# Altium schematic symbol library LATTICEPLDS_Library.SchLib: 291 symbols (part 29 of 32)
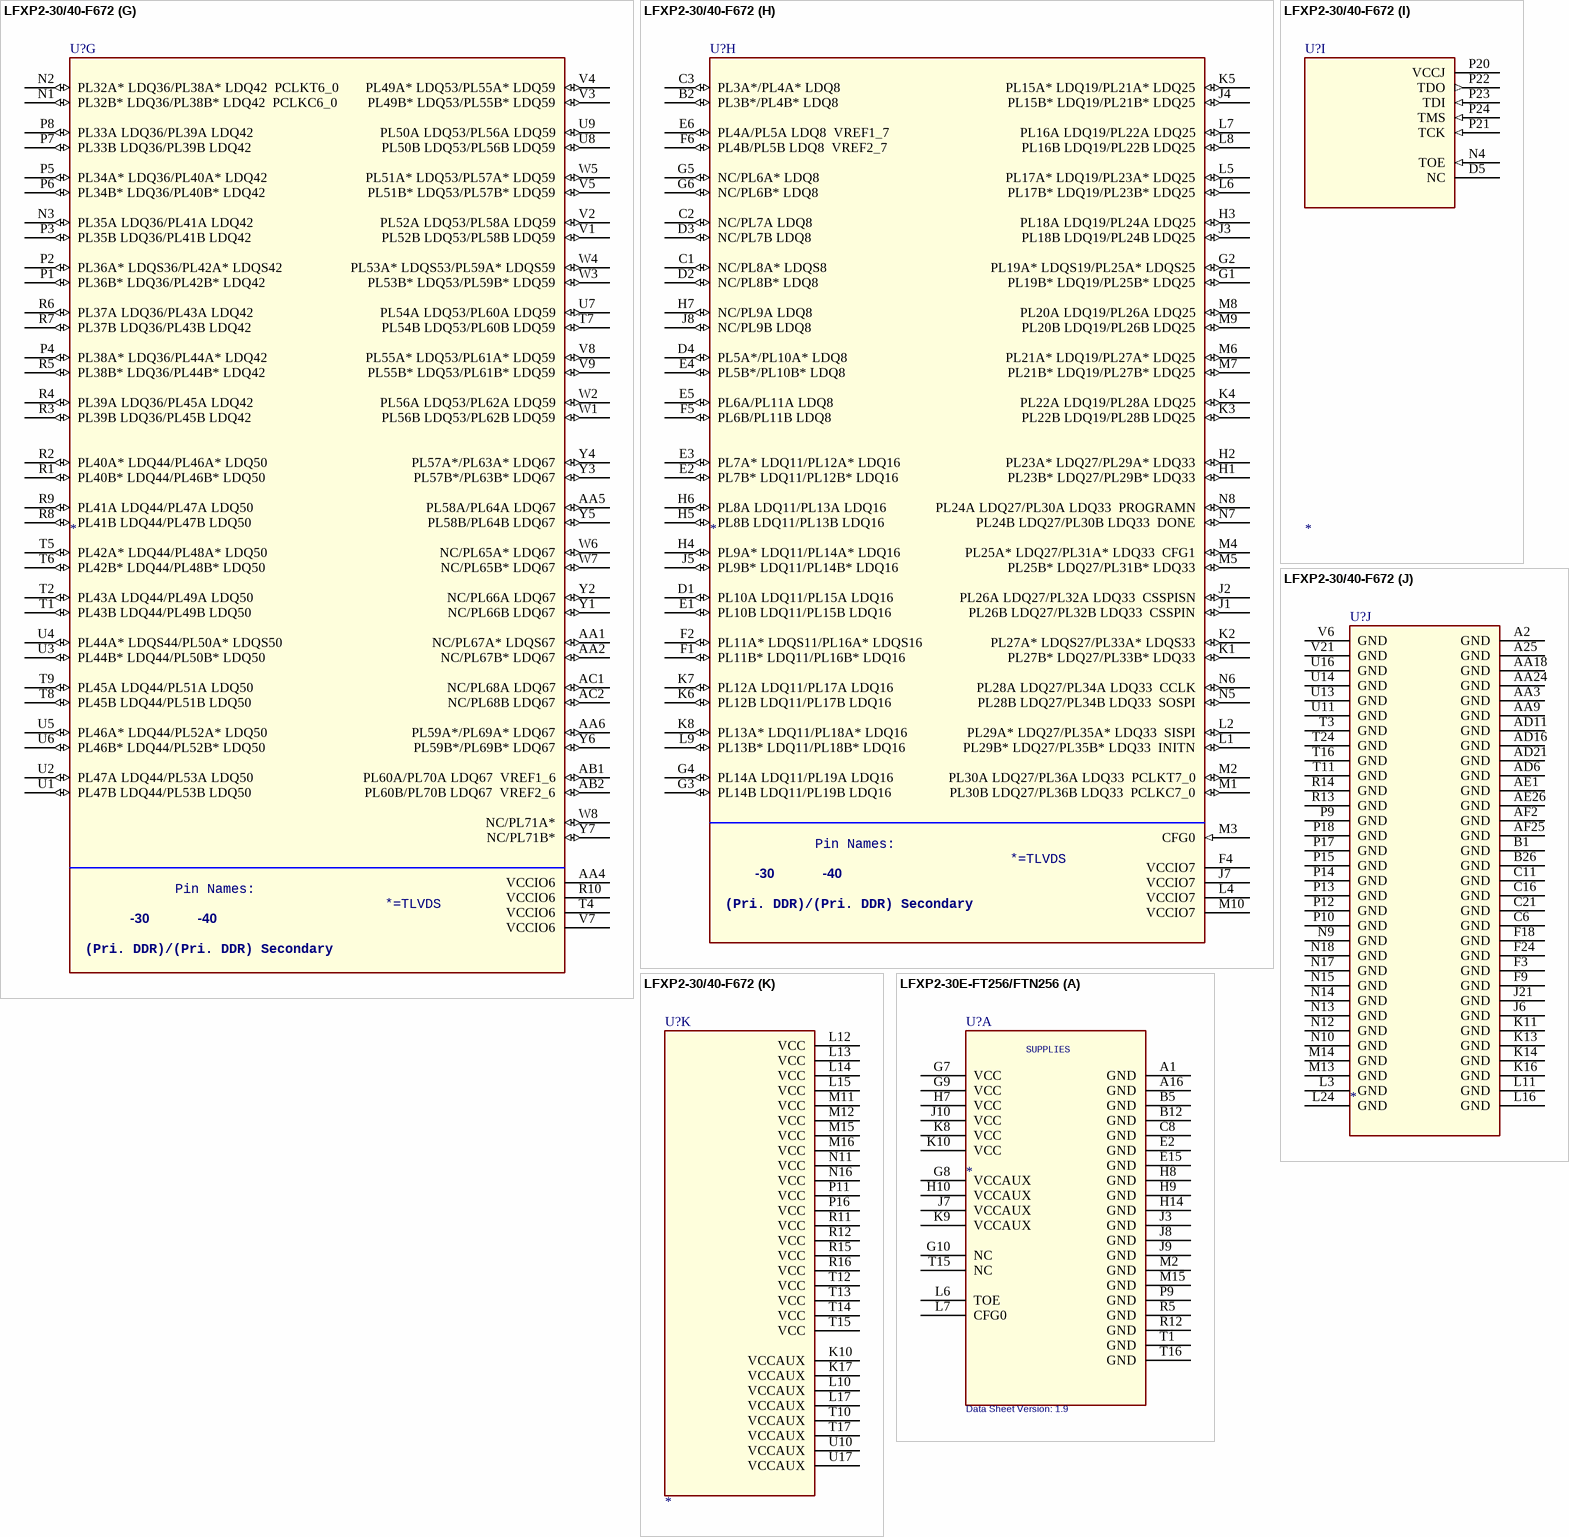
[diagram p331: symbols LFXP2-30/40-F672 to LFXP2-30E-FT256/FTN256]

## LFXP2-30/40-F672
designator U?
SWAP_INFO: (S1+S2+S3+S4+S5+S6+S7+S8+S9+S10+S11); SPLIT_INST: TRUE
part A pins: A3 PT4B TDQ6/PT4B TDQ6  ULC_GPLLC_IN_A (io), A4 PT9A TDQ6/PT9A TDQ6 (io), A5 PT9B TDQ6/PT9B TDQ6 (io), A6 PT10B TDQ6/PT10B TDQ6 (io), A7 PT14A TDQ15/PT14A TDQ15 (io), A8 PT17A TDQ15/PT17A TDQ15 (io), A9 PT18A TDQ15/PT18A TDQ15 (io), A10 PT22A TDQ24/PT22A TDQ24 (io), A11 PT25A TDQ24/PT25A TDQ24 (io), A12 PT26A TDQ24/PT26A TDQ24 (io), A13 PT29A TDQ33/PT29A TDQ33 (io), A14 PT33A TDQS33/PT33A TDQS33 (io), B3 PT4A TDQ6/PT4A TDQ6  ULC_GPLLT_IN_A (io), B4 PT6A TDQS6/PT6A TDQS6 (io), B5 PT6B TDQ6/PT6B TDQ6 (io), B6 PT10A TDQ6/PT10A TDQ6 (io), B7 PT14B TDQ15/PT14B TDQ15 (io), B8 PT17B TDQ15/PT17B TDQ15 (io), B9 PT18B TDQ15/PT18B TDQ15 (io), B10 PT22B TDQ24/PT22B TDQ24 (io), B11 PT25B TDQ24/PT25B TDQ24 (io), B12 PT26B TDQ24/PT26B TDQ24 (io), B13 PT29B TDQ33/PT29B TDQ33 (io), B14 PT33B TDQ33/PT33B TDQ33 (io), C4 PT5A TDQ6/PT5A TDQ6  ULC_GPLLT_FB_A (io), C5 PT5B TDQ6/PT5B TDQ6  ULC_GPLLC_FB_A (io), C7 PT7B TDQ6/PT7B TDQ6 (io), C8 PT13A TDQ15/PT13A TDQ15 (io), C9 PT15B TDQ15/PT15B TDQ15 (io), C10 PT21A TDQ24/PT21A TDQ24 (io), C12 PT30A TDQ33/PT30A TDQ33 (io), C13 PT34A TDQ33/PT34A TDQ33 (io), C14 PT37A TDQ33/PT37A TDQ33  PCLKT0_0 (io), C15 PT37B TDQ33/PT37B TDQ33  PCLKC0_0 (io), D6 VCCIO0 (power), D7 PT7A TDQ6/PT7A TDQ6 (io), D8 PT13B TDQ15/PT13B TDQ15 (io), D9 PT15A TDQS15/PT15A TDQS15 (io), D10 PT21B TDQ24/PT21B TDQ24 (io), D11 VCCIO0 (power), D12 PT30B TDQ33/PT30B TDQ33 (io), D13 PT34B TDQ33/PT34B TDQ33 (io), E7 PT11A TDQ15/PT11A TDQ15 (io), E8 PT11B TDQ15/PT11B TDQ15 (io), E9 PT16A TDQ15/PT16A TDQ15 (io), E10 PT16B TDQ15/PT16B TDQ15 (io), E11 PT27B TDQ24/PT27B TDQ24 (io), E12 PT31B TDQ33/PT31B TDQ33 (io), E13 PT35B TDQ33/PT35B TDQ33 (io), F7 PT3A TDQ6/PT3A TDQ6  VREF1_0 (io), F8 PT8B TDQ6/PT8B TDQ6 (io), F10 PT23B TDQ24/PT23B TDQ24 (io), F11 PT27A TDQ24/PT27A TDQ24 (io), F12 PT31A TDQ33/PT31A TDQ33 (io), F13 PT35A TDQ33/PT35A TDQ33 (io), G7 PT3B TDQ6/PT3B TDQ6  VREF2_0 (io), G8 PT8A TDQ6/PT8A TDQ6 (io), G9 VCCIO0 (power), G10 PT19B TDQ15/PT19B TDQ15 (io), G11 PT23A TDQ24/PT23A TDQ24 (io), G12 PT32A TDQ33/PT32A TDQ33 (io), G13 PT32B TDQ33/PT32B TDQ33 (io), H8 PT12B TDQ15/PT12B TDQ15 (io), H9 PT12A TDQ15/PT12A TDQ15 (io), H10 PT19A TDQ15/PT19A TDQ15 (io), H11 PT24A TDQS24/PT24A TDQS24 (io), H12 PT28A TDQ24/PT28A TDQ24 (io), H13 PT36B TDQ33/PT36B TDQ33 (io), J9 PT20A TDQ24/PT20A TDQ24 (io), J10 PT24B TDQ24/PT24B TDQ24 (io), J11 PT28B TDQ24/PT28B TDQ24 (io), J12 PT36A TDQ33/PT36A TDQ33 (io), K9 PT20B TDQ24/PT20B TDQ24 (io), K12 VCCIO0 (power)
part B pins: A15 PT38A TDQ42/PT38A TDQ42  PCLKT1_0 (io), A16 PT41A TDQ42/PT41A TDQ42 (io), A17 PT42A TDQS42/PT42A TDQS42 (io), A18 PT45A TDQ42/PT45A TDQ42 (io), A19 PT46A TDQ42/PT46A TDQ42 (io), A20 PT53A TDQ51/PT53A TDQ51 (io), A21 PT58A TDQ60/PT58A TDQ60 (io), A22 PT61A TDQ60/PT61A TDQ60 (io), A23 PT61B TDQ60/PT61B TDQ60 (io), A24 NC/PT62B TDQ60 (io), B15 PT38B TDQ42/PT38B TDQ42  PCLKC1_0 (io), B16 PT41B TDQ42/PT41B TDQ42 (io), B17 PT42B TDQ42/PT42B TDQ42 (io), B18 PT45B TDQ42/PT45B TDQ42 (io), B19 PT46B TDQ42/PT46B TDQ42 (io), B20 PT53B TDQ51/PT53B TDQ51 (io), B21 PT58B TDQ60/PT58B TDQ60 (io), B22 NC/PT63A TDQ60 (io), B23 NC/PT62A TDQ60 (io), B24 NC/PT65B TDQ69 (io), B25 NC/PT66B TDQ69 (io), C17 PT47B TDQ51/PT47B TDQ51 (io), C18 PT49A TDQ51/PT49A TDQ51 (io), C19 PT50A TDQ51/PT50A TDQ51 (io), C20 PT54A TDQ51/PT54A TDQ51 (io), C22 NC/PT63B TDQ60 (io), C23 NC/PT65A TDQ69 (io), C24 NC/PT66A TDQ69 (io), C25 PT63A TDQ60/PT71A TDQ69  URC_GPLLT_FB_A (io), C26 PT63B TDQ60/PT71B TDQ69  URC_GPLLC_FB_A (io), D14 PT39B TDQ42/PT39B TDQ42 (io), D15 PT43B TDQ42/PT43B TDQ42 (io), D16 VCCIO1 (power), D17 PT47A TDQ51/PT47A TDQ51 (io), D18 PT49B TDQ51/PT49B TDQ51 (io), D19 PT50B TDQ51/PT50B TDQ51 (io), D20 PT54B TDQ51/PT54B TDQ51 (io), D21 VCCIO1 (power), D22 NC/PT67A TDQ69 (io), D23 NC/PT69A TDQS69 (io), E14 PT43A TDQ42/PT43A TDQ42 (io), E15 PT48A TDQ51/PT48A TDQ51 (io), E16 PT51B TDQ51/PT51B TDQ51 (io), E17 PT55B TDQ51/PT55B TDQ51 (io), E18 PT55A TDQ51/PT55A TDQ51 (io), E19 PT57A TDQ60/PT57A TDQ60 (io), E20 PT59B TDQ60/PT59B TDQ60 (io), E21 PT59A TDQ60/PT59A TDQ60 (io), E22 NC/PT67B TDQ69 (io), E23 NC/PT69B TDQ69 (io), F14 PT39A TDQ42/PT39A TDQ42 (io), F15 PT48B TDQ51/PT48B TDQ51 (io), F16 PT51A TDQS51/PT51A TDQS51 (io), F17 PT56B TDQ60/PT56B TDQ60 (io), F19 PT57B TDQ60/PT57B TDQ60 (io), F20 PT62A TDQ60/PT70A TDQ69  URC_GPLLT_IN_A (io), G14 PT44A TDQ42/PT44A TDQ42 (io), G15 PT44B TDQ42/PT44B TDQ42 (io), G16 PT56A TDQ60/PT56A TDQ60 (io), G17 NC/PT64A TDQ60 (io), G18 VCCIO1 (power), G19 PT62B TDQ60/PT70B TDQ69  URC_GPLLC_IN_A (io), G20 PT64B TDQ60/PT72B TDQ69  VREF2_1 (io), H14 PT40B TDQ42/PT40B TDQ42 (io), H15 PT52B TDQ51/PT52B TDQ51 (io), H16 NC/PT64B TDQ60 (io), H17 NC/PT68B TDQ69 (io), H18 NC/PT68A TDQ69 (io), H19 PT64A TDQ60/PT72A TDQ69  VREF1_1 (io), J13 PT40A TDQ42/PT40A TDQ42 (io), J14 PT52A TDQ51/PT52A TDQ51 (io), J15 PT60A TDQS60/PT60A TDQS60 (io), J16 PT60B TDQ60/PT60B TDQ60 (io), K15 VCCIO1 (power)
part C pins: D24 PR3A*/PR4A* RDQ8 (io), D25 PR6A/PR7A RDQ8 (io), D26 PR6B/PR7B RDQ8 (io), E24 PR3B*/PR4B* RDQ8 (io), E25 NC/PR8A* RDQS8 (io), E26 NC/PR8B* RDQ8 (io), F21 PR5B*/PR6B* RDQ8 (io), F22 PR4B/PR5B RDQ8  VREF2_2 (io), F23 VCCIO2 (power), F25 PR7A* RDQ11/PR12A* RDQ16 (io), F26 PR7B* RDQ11/PR12B* RDQ16 (io), G21 PR4A/PR5A RDQ8  VREF1_2 (io), G22 PR5A*/PR6A* RDQ8 (io), G23 NC/PR11B RDQ8 (io), G24 NC/PR11A RDQ8 (io), G25 PR10B RDQ11/PR15B RDQ16 (io), G26 PR10A RDQ11/PR15A RDQ16 (io), H20 NC/PR9A RDQ8 (io), H21 NC/PR9B RDQ8 (io), H22 PR8A RDQ11/PR13A RDQ16 (io), H23 PR9B* RDQ11/PR14B* RDQ16 (io), H24 PR9A* RDQ11/PR14A* RDQ16 (io), H25 PR14B RDQ11/PR19B RDQ16 (io), H26 PR14A RDQ11/PR19A RDQ16 (io), J17 PR16A RDQ19/PR22A RDQ25 (io), J18 NC/PR10B* RDQ8 (io), J19 NC/PR10A* RDQ8 (io), J20 VCCIO2 (power), J22 PR8B RDQ11/PR13B RDQ16 (io), J23 PR11B* RDQ11/PR16B* RDQ16 (io), J24 PR11A* RDQS11/PR16A* RDQS16 (io), J25 PR18B RDQ19/PR24B RDQ25 (io), J26 PR18A RDQ19/PR24A RDQ25 (io), K18 PR16B RDQ19/PR22B RDQ25 (io), K19 PR12B RDQ11/PR17B RDQ16 (io), K20 PR12A RDQ11/PR17A RDQ16 (io), K21 PR13B* RDQ11/PR18B* RDQ16 (io), K22 PR13A* RDQ11/PR18A* RDQ16 (io), K23 PR15B* RDQ19/PR21B* RDQ25 (io), K24 PR15A* RDQ19/PR21A* RDQ25 (io), K25 PR19B* RDQ19/PR25B* RDQ25 (io), K26 PR19A* RDQS19/PR25A* RDQS25 (io), L18 PR24A RDQ27/PR30A RDQ33 (io), L19 PR20B RDQ19/PR26B RDQ25 (io), L20 PR20A RDQ19/PR26A RDQ25 (io), L21 PR17B* RDQ19/PR23B* RDQ25 (io), L22 PR17A* RDQ19/PR23A* RDQ25 (io), L23 VCCIO2 (power), L25 PR22B RDQ19/PR28B RDQ25 (io), L26 PR22A RDQ19/PR28A RDQ25 (io), M17 VCCIO2 (power), M18 PR25B* RDQ27/PR31B* RDQ33 (io), M19 PR24B RDQ27/PR30B RDQ33 (io), M20 PR25A* RDQ27/PR31A* RDQ33 (io), M21 PR21B* RDQ19/PR27B* RDQ25 (io), M22 PR21A* RDQ19/PR27A* RDQ25 (io), M23 PR23B* RDQ27/PR29B* RDQ33 (io), M24 PR23A* RDQ27/PR29A* RDQ33 (io), M25 PR26B RDQ27/PR32B RDQ33 (io), M26 PR26A RDQ27/PR32A RDQ33 (io), N19 PR29B* RDQ27/PR35B* RDQ33 (io), N20 PR29A* RDQ27/PR35A* RDQ33 (io), N21 PR28A RDQ27/PR34A RDQ33 (io), N22 PR28B RDQ27/PR34B RDQ33 (io), N23 PR27B* RDQ27/PR33B* RDQ33 (io), N24 PR27A* RDQS27/PR33A* RDQS33 (io), N25 PR30B RDQ27/PR36B RDQ33  PCLKC2_0 (io), N26 PR30A RDQ27/PR36A RDQ33  PCLKT2_0 (io)
part D pins: AA21 NC/PR67B* RDQ67 (io), AA22 PR59A*/PR69A* RDQ67 (io), AA23 VCCIO3 (power), AA25 PR49B* RDQ53/PR55B* RDQ59 (io), AA26 PR49A* RDQ53/PR55A* RDQ59 (io), AB21 PR59B*/PR69B* RDQ67 (io), AB22 NC/PR71B* (io), AB23 PR56B RDQ53/PR62B RDQ59 (io), AB24 PR56A RDQ53/PR62A RDQ59 (io), AB25 PR52B RDQ53/PR58B RDQ59 (io), AB26 PR52A RDQ53/PR58A RDQ59 (io), AC22 NC/PR71A* (io), AC23 PR57B*/PR63B* RDQ67 (io), AC24 PR57A*/PR63A* RDQ67 (io), AC25 PR53B* RDQ53/PR59B* RDQ59 (io), AC26 PR53A* RDQS53/PR59A* RDQS59 (io), AD23 PR60B/PR70B RDQ67  VREF2_3 (io), AD24 PR60A/PR70A RDQ67  VREF1_3 (io), AD25 NC/PR66B RDQ67 (io), AD26 NC/PR66A RDQ67 (io), P19 PR33A RDQ36/PR39A RDQ42 (io), P25 PR32B* RDQ36/PR38B* RDQ42  PCLKC3_0 (io), P26 PR32A* RDQ36/PR38A* RDQ42  PCLKT3_0 (io), R17 VCCIO3 (power), R18 PR33B RDQ36/PR39B RDQ42 (io), R19 PR37A RDQ36/PR43A RDQ42 (io), R20 PR37B RDQ36/PR43B RDQ42 (io), R21 PR34B* RDQ36/PR40B* RDQ42 (io), R22 PR34A* RDQ36/PR40A* RDQ42 (io), R23 PR36B* RDQ36/PR42B* RDQ42 (io), R24 PR36A* RDQS36/PR42A* RDQS42 (io), R25 PR35B RDQ36/PR41B RDQ42 (io), R26 PR35A RDQ36/PR41A RDQ42 (io), T18 PR41A RDQ44/PR47A RDQ50 (io), T19 PR41B RDQ44/PR47B RDQ50 (io), T20 PR45B RDQ44/PR51B RDQ50 (io), T21 PR45A RDQ44/PR51A RDQ50 (io), T22 PR38B* RDQ36/PR44B* RDQ42 (io), T23 VCCIO3 (power), T25 PR39B RDQ36/PR45B RDQ42 (io), T26 PR39A RDQ36/PR45A RDQ42 (io), U18 PR50A RDQ53/PR56A RDQ59 (io), U19 PR50B RDQ53/PR56B RDQ59 (io), U20 PR54B RDQ53/PR60B RDQ59 (io), U21 PR54A RDQ53/PR60A RDQ59 (io), U22 PR38A* RDQ36/PR44A* RDQ42 (io), U23 PR42B* RDQ44/PR48B* RDQ50 (io), U24 PR42A* RDQ44/PR48A* RDQ50 (io), U25 PR40B* RDQ44/PR46B* RDQ50 (io), U26 PR40A* RDQ44/PR46A* RDQ50 (io), V19 NC/PR68A RDQ67 (io), V20 VCCIO3 (power), V22 PR58A/PR64A RDQ67 (io), V23 PR46B* RDQ44/PR52B* RDQ50 (io), V24 PR46A* RDQ44/PR52A* RDQ50 (io), V25 PR43B RDQ44/PR49B RDQ50 (io), V26 PR43A RDQ44/PR49A RDQ50 (io), W20 NC/PR68B RDQ67 (io), W21 PR58B/PR64B RDQ67 (io), W22 NC/PR65A* RDQ67 (io), W23 PR51B* RDQ53/PR57B* RDQ59 (io), W24 PR51A* RDQ53/PR57A* RDQ59 (io), W25 PR44B* RDQ44/PR50B* RDQ50 (io), W26 PR44A* RDQS44/PR50A* RDQS50 (io), Y21 NC/PR65B* RDQ67 (io), Y22 NC/PR67A* RDQS67 (io), Y23 PR55B* RDQ53/PR61B* RDQ59 (io), Y24 PR55A* RDQ53/PR61A* RDQ59 (io), Y25 PR47B RDQ44/PR53B RDQ50 (io), Y26 PR47A RDQ44/PR53A RDQ50 (io)
part E pins: AA14 PB39A BDQ42/PB39A BDQ42 (io), AA15 PB44B BDQ42/PB44B BDQ42 (io), AA16 PB47A BDQ51/PB47A BDQ51 (io), AA17 PB59A BDQ60/PB59A BDQ60 (io), AA19 NC/PB68A BDQ69 (io), AA20 PB63B BDQ60/PB71B BDQ69  LRC_GPLLC_FB_A (io), AB14 PB39B BDQ42/PB39B BDQ42 (io), AB15 PB44A BDQ42/PB44A BDQ42 (io), AB16 PB47B BDQ51/PB47B BDQ51 (io), AB17 PB59B BDQ60/PB59B BDQ60 (io), AB18 NC/PB63A BDQ60 (io), AB19 NC/PB63B BDQ60 (io), AB20 PB63A BDQ60/PB71A BDQ69  LRC_GPLLT_FB_A (io), AC15 PB43A BDQ42/PB43A BDQ42 (io), AC16 VCCIO4 (power), AC17 PB51A BDQS51/PB51A BDQS51 (io), AC18 PB55A BDQ51/PB55A BDQ51 (io), AC19 NC/PB67A BDQ69 (io), AC20 PB62B BDQ60/PB70B BDQ69  LRC_GPLLC_IN_A (io), AC21 VCCIO4 (power), AD15 PB43B BDQ42/PB43B BDQ42 (io), AD17 PB51B BDQ51/PB51B BDQ51 (io), AD18 PB55B BDQ51/PB55B BDQ51 (io), AD19 NC/PB67B BDQ69 (io), AD20 PB62A BDQ60/PB70A BDQ69  LRC_GPLLT_IN_A (io), AD22 NC/PB69B BDQ69 (io), AE10 PB38A BDQ42/PB38A BDQ42  PCLKT4_0 (io), AE11 PB41A BDQ42/PB41A BDQ42 (io), AE12 PB42A BDQS42/PB42A BDQS42 (io), AE13 PB45A BDQ42/PB45A BDQ42 (io), AE14 PB46A BDQ42/PB46A BDQ42 (io), AE15 PB49A BDQ51/PB49A BDQ51 (io), AE16 PB50A BDQ51/PB50A BDQ51 (io), AE17 PB53A BDQ51/PB53A BDQ51 (io), AE18 PB54A BDQ51/PB54A BDQ51 (io), AE19 PB57A BDQ60/PB57A BDQ60 (io), AE20 PB58A BDQ60/PB58A BDQ60 (io), AE21 PB61B BDQ60/PB61B BDQ60 (io), AE22 NC/PB62B BDQ60 (io), AE23 NC/PB69A BDQS69 (io), AE24 NC/PB66B BDQ69 (io), AE25 NC/PB66A BDQ69 (io), AF10 PB38B BDQ42/PB38B BDQ42  PCLKC4_0 (io), AF11 PB41B BDQ42/PB41B BDQ42 (io), AF12 PB42B BDQ42/PB42B BDQ42 (io), AF13 PB45B BDQ42/PB45B BDQ42 (io), AF14 PB46B BDQ42/PB46B BDQ42 (io), AF15 PB49B BDQ51/PB49B BDQ51 (io), AF16 PB50B BDQ51/PB50B BDQ51 (io), AF17 PB53B BDQ51/PB53B BDQ51 (io), AF18 PB54B BDQ51/PB54B BDQ51 (io), AF19 PB57B BDQ60/PB57B BDQ60 (io), AF20 PB58B BDQ60/PB58B BDQ60 (io), AF21 PB61A BDQ60/PB61A BDQ60 (io), AF22 NC/PB62A BDQ60 (io), AF23 NC/PB65A BDQ69 (io), AF24 NC/PB65B BDQ69 (io), U15 VCCIO4 (power), V15 PB40A BDQ42/PB40A BDQ42 (io), V16 PB52A BDQ51/PB52A BDQ51 (io), V17 PB60A BDQS60/PB60A BDQS60 (io), V18 NC/PB64A BDQ60 (io), W15 PB40B BDQ42/PB40B BDQ42 (io), W16 PB52B BDQ51/PB52B BDQ51 (io), W17 PB60B BDQ60/PB60B BDQ60 (io), W18 NC/PB64B BDQ60 (io), W19 PB64A BDQ60/PB72A BDQ69  VREF1_4 (io), Y14 PB48A BDQ51/PB48A BDQ51 (io), Y15 PB48B BDQ51/PB48B BDQ51 (io), Y16 PB56A BDQ60/PB56A BDQ60 (io), Y17 PB56B BDQ60/PB56B BDQ60 (io), Y18 VCCIO4 (power), Y19 NC/PB68B BDQ69 (io), Y20 PB64B BDQ60/PB72B BDQ69  VREF2_4 (io)
part F pins: AA7 PB5A BDQ6/PB5A BDQ6  LLC_GPLLT_FB_A (io), AA8 PB3A BDQ6/PB3A BDQ6  VREF1_5 (io), AA10 PB15B BDQ15/PB15B BDQ15 (io), AA11 PB20B BDQ24/PB20B BDQ24 (io), AA12 PB23A BDQ24/PB23A BDQ24 (io), AA13 PB36B BDQ33/PB36B BDQ33 (io), AB3 PB4A BDQ6/PB4A BDQ6  LLC_GPLLT_IN_A (io), AB4 PB4B BDQ6/PB4B BDQ6  LLC_GPLLC_IN_A (io), AB5 PB9A BDQ6/PB9A BDQ6 (io), AB6 PB7B BDQ6/PB7B BDQ6 (io), AB7 PB7A BDQ6/PB7A BDQ6 (io), AB8 PB11A BDQ15/PB11A BDQ15 (io), AB9 PB18A BDQ15/PB18A BDQ15 (io), AB10 PB18B BDQ15/PB18B BDQ15 (io), AB11 PB19A BDQ15/PB19A BDQ15 (io), AB12 PB23B BDQ24/PB23B BDQ24 (io), AB13 PB36A BDQ33/PB36A BDQ33 (io), AC3 PB6A BDQS6/PB6A BDQS6 (io), AC4 PB6B BDQ6/PB6B BDQ6 (io), AC5 PB9B BDQ6/PB9B BDQ6 (io), AC6 VCCIO5 (power), AC7 PB11B BDQ15/PB11B BDQ15 (io), AC8 PB22A BDQ24/PB22A BDQ24 (io), AC9 PB22B BDQ24/PB22B BDQ24 (io), AC10 PB19B BDQ15/PB19B BDQ15 (io), AC11 VCCIO5 (power), AC12 PB27A BDQ24/PB27A BDQ24 (io), AC13 PB31A BDQ33/PB31A BDQ33 (io), AC14 PB35A BDQ33/PB35A BDQ33 (io), AD1 PB10A BDQ6/PB10A BDQ6 (io), AD2 PB10B BDQ6/PB10B BDQ6 (io), AD3 PB14A BDQ15/PB14A BDQ15 (io), AD4 PB13A BDQ15/PB13A BDQ15 (io), AD5 PB13B BDQ15/PB13B BDQ15 (io), AD7 PB29B BDQ33/PB29B BDQ33 (io), AD8 PB29A BDQ33/PB29A BDQ33 (io), AD9 PB33B BDQ33/PB33B BDQ33 (io), AD10 PB33A BDQS33/PB33A BDQS33 (io), AD12 PB27B BDQ24/PB27B BDQ24 (io), AD13 PB31B BDQ33/PB31B BDQ33 (io), AD14 PB35B BDQ33/PB35B BDQ33 (io), AE2 PB14B BDQ15/PB14B BDQ15 (io), AE3 PB17A BDQ15/PB17A BDQ15 (io), AE4 PB21A BDQ24/PB21A BDQ24 (io), AE5 PB21B BDQ24/PB21B BDQ24 (io), AE6 PB26A BDQ24/PB26A BDQ24 (io), AE7 PB30A BDQ33/PB30A BDQ33 (io), AE8 PB34A BDQ33/PB34A BDQ33 (io), AE9 PB37A BDQ33/PB37A BDQ33  PCLKT5_0 (io), AF3 PB17B BDQ15/PB17B BDQ15 (io), AF4 PB25A BDQ24/PB25A BDQ24 (io), AF5 PB25B BDQ24/PB25B BDQ24 (io), AF6 PB26B BDQ24/PB26B BDQ24 (io), AF7 PB30B BDQ33/PB30B BDQ33 (io), AF8 PB34B BDQ33/PB34B BDQ33 (io), AF9 PB37B BDQ33/PB37B BDQ33  PCLKC5_0 (io), U12 VCCIO5 (power), V10 PB8A BDQ6/PB8A BDQ6 (io), V11 PB12A BDQ15/PB12A BDQ15 (io), V12 PB16A BDQ15/PB16A BDQ15 (io), V13 PB24A BDQS24/PB24A BDQS24 (io), V14 PB32A BDQ33/PB32A BDQ33 (io), W9 PB5B BDQ6/PB5B BDQ6  LLC_GPLLC_FB_A (io), W10 PB8B BDQ6/PB8B BDQ6 (io), W11 PB12B BDQ15/PB12B BDQ15 (io), W12 PB16B BDQ15/PB16B BDQ15 (io), W13 PB24B BDQ24/PB24B BDQ24 (io), W14 PB32B BDQ33/PB32B BDQ33 (io), Y8 PB3B BDQ6/PB3B BDQ6  VREF2_5 (io), Y9 VCCIO5 (power), Y10 PB15A BDQS15/PB15A BDQS15 (io), Y11 PB20A BDQ24/PB20A BDQ24 (io), Y12 PB28A BDQ24/PB28A BDQ24 (io), Y13 PB28B BDQ24/PB28B BDQ24 (io)
part G pins: AA1 NC/PL67A* LDQS67 (io), AA2 NC/PL67B* LDQ67 (io), AA4 VCCIO6 (power), AA5 PL58A/PL64A LDQ67 (io), AA6 PL59A*/PL69A* LDQ67 (io), AB1 PL60A/PL70A LDQ67  VREF1_6 (io), AB2 PL60B/PL70B LDQ67  VREF2_6 (io), AC1 NC/PL68A LDQ67 (io), AC2 NC/PL68B LDQ67 (io), N1 PL32B* LDQ36/PL38B* LDQ42  PCLKC6_0 (io), N2 PL32A* LDQ36/PL38A* LDQ42  PCLKT6_0 (io), N3 PL35A LDQ36/PL41A LDQ42 (io), P1 PL36B* LDQ36/PL42B* LDQ42 (io), P2 PL36A* LDQS36/PL42A* LDQS42 (io), P3 PL35B LDQ36/PL41B LDQ42 (io), P4 PL38A* LDQ36/PL44A* LDQ42 (io), P5 PL34A* LDQ36/PL40A* LDQ42 (io), P6 PL34B* LDQ36/PL40B* LDQ42 (io), P7 PL33B LDQ36/PL39B LDQ42 (io), P8 PL33A LDQ36/PL39A LDQ42 (io), R1 PL40B* LDQ44/PL46B* LDQ50 (io), R2 PL40A* LDQ44/PL46A* LDQ50 (io), R3 PL39B LDQ36/PL45B LDQ42 (io), R4 PL39A LDQ36/PL45A LDQ42 (io), R5 PL38B* LDQ36/PL44B* LDQ42 (io), R6 PL37A LDQ36/PL43A LDQ42 (io), R7 PL37B LDQ36/PL43B LDQ42 (io), R8 PL41B LDQ44/PL47B LDQ50 (io), R9 PL41A LDQ44/PL47A LDQ50 (io), R10 VCCIO6 (power), T1 PL43B LDQ44/PL49B LDQ50 (io), T2 PL43A LDQ44/PL49A LDQ50 (io), T4 VCCIO6 (power), T5 PL42A* LDQ44/PL48A* LDQ50 (io), T6 PL42B* LDQ44/PL48B* LDQ50 (io), T7 PL54B LDQ53/PL60B LDQ59 (io), T8 PL45B LDQ44/PL51B LDQ50 (io), T9 PL45A LDQ44/PL51A LDQ50 (io), U1 PL47B LDQ44/PL53B LDQ50 (io), U2 PL47A LDQ44/PL53A LDQ50 (io), U3 PL44B* LDQ44/PL50B* LDQ50 (io), U4 PL44A* LDQS44/PL50A* LDQS50 (io), U5 PL46A* LDQ44/PL52A* LDQ50 (io), U6 PL46B* LDQ44/PL52B* LDQ50 (io), U7 PL54A LDQ53/PL60A LDQ59 (io), U8 PL50B LDQ53/PL56B LDQ59 (io), U9 PL50A LDQ53/PL56A LDQ59 (io), V1 PL52B LDQ53/PL58B LDQ59 (io), V2 PL52A LDQ53/PL58A LDQ59 (io), V3 PL49B* LDQ53/PL55B* LDQ59 (io), V4 PL49A* LDQ53/PL55A* LDQ59 (io), V5 PL51B* LDQ53/PL57B* LDQ59 (io), V7 VCCIO6 (power), V8 PL55A* LDQ53/PL61A* LDQ59 (io), V9 PL55B* LDQ53/PL61B* LDQ59 (io), W1 PL56B LDQ53/PL62B LDQ59 (io), W2 PL56A LDQ53/PL62A LDQ59 (io), W3 PL53B* LDQ53/PL59B* LDQ59 (io), W4 PL53A* LDQS53/PL59A* LDQS59 (io), W5 PL51A* LDQ53/PL57A* LDQ59 (io), W6 NC/PL65A* LDQ67 (io), W7 NC/PL65B* LDQ67 (io), W8 NC/PL71A* (io), Y1 NC/PL66B LDQ67 (io), Y2 NC/PL66A LDQ67 (io), Y3 PL57B*/PL63B* LDQ67 (io), Y4 PL57A*/PL63A* LDQ67 (io), Y5 PL58B/PL64B LDQ67 (io), Y6 PL59B*/PL69B* LDQ67 (io), Y7 NC/PL71B* (io)
part H pins: B2 PL3B*/PL4B* LDQ8 (io), C1 NC/PL8A* LDQS8 (io), C2 NC/PL7A LDQ8 (io), C3 PL3A*/PL4A* LDQ8 (io), D1 PL10A LDQ11/PL15A LDQ16 (io), D2 NC/PL8B* LDQ8 (io), D3 NC/PL7B LDQ8 (io), D4 PL5A*/PL10A* LDQ8 (io), E1 PL10B LDQ11/PL15B LDQ16 (io), E2 PL7B* LDQ11/PL12B* LDQ16 (io), E3 PL7A* LDQ11/PL12A* LDQ16 (io), E4 PL5B*/PL10B* LDQ8 (io), E5 PL6A/PL11A LDQ8 (io), E6 PL4A/PL5A LDQ8  VREF1_7 (io), F1 PL11B* LDQ11/PL16B* LDQ16 (io), F2 PL11A* LDQS11/PL16A* LDQS16 (io), F4 VCCIO7 (power), F5 PL6B/PL11B LDQ8 (io), F6 PL4B/PL5B LDQ8  VREF2_7 (io), G1 PL19B* LDQ19/PL25B* LDQ25 (io), G2 PL19A* LDQS19/PL25A* LDQS25 (io), G3 PL14B LDQ11/PL19B LDQ16 (io), G4 PL14A LDQ11/PL19A LDQ16 (io), G5 NC/PL6A* LDQ8 (io), G6 NC/PL6B* LDQ8 (io), H1 PL23B* LDQ27/PL29B* LDQ33 (io), H2 PL23A* LDQ27/PL29A* LDQ33 (io), H3 PL18A LDQ19/PL24A LDQ25 (io), H4 PL9A* LDQ11/PL14A* LDQ16 (io), H5 PL8B LDQ11/PL13B LDQ16 (io), H6 PL8A LDQ11/PL13A LDQ16 (io), H7 NC/PL9A LDQ8 (io), J1 PL26B LDQ27/PL32B LDQ33  CSSPIN (io), J2 PL26A LDQ27/PL32A LDQ33  CSSPISN (io), J3 PL18B LDQ19/PL24B LDQ25 (io), J4 PL15B* LDQ19/PL21B* LDQ25 (io), J5 PL9B* LDQ11/PL14B* LDQ16 (io), J7 VCCIO7 (power), J8 NC/PL9B LDQ8 (io), K1 PL27B* LDQ27/PL33B* LDQ33 (io), K2 PL27A* LDQS27/PL33A* LDQS33 (io), K3 PL22B LDQ19/PL28B LDQ25 (io), K4 PL22A LDQ19/PL28A LDQ25 (io), K5 PL15A* LDQ19/PL21A* LDQ25 (io), K6 PL12B LDQ11/PL17B LDQ16 (io), K7 PL12A LDQ11/PL17A LDQ16 (io), K8 PL13A* LDQ11/PL18A* LDQ16 (io), L1 PL29B* LDQ27/PL35B* LDQ33  INITN (io), L2 PL29A* LDQ27/PL35A* LDQ33  SISPI (io), L4 VCCIO7 (power), L5 PL17A* LDQ19/PL23A* LDQ25 (io), L6 PL17B* LDQ19/PL23B* LDQ25 (io), L7 PL16A LDQ19/PL22A LDQ25 (io), L8 PL16B LDQ19/PL22B LDQ25 (io), L9 PL13B* LDQ11/PL18B* LDQ16 (io), M1 PL30B LDQ27/PL36B LDQ33  PCLKC7_0 (io), M2 PL30A LDQ27/PL36A LDQ33  PCLKT7_0 (io), M3 CFG0 (in), M4 PL25A* LDQ27/PL31A* LDQ33  CFG1 (io), M5 PL25B* LDQ27/PL31B* LDQ33 (io), M6 PL21A* LDQ19/PL27A* LDQ25 (io), M7 PL21B* LDQ19/PL27B* LDQ25 (io), M8 PL20A LDQ19/PL26A LDQ25 (io), M9 PL20B LDQ19/PL26B LDQ25 (io), M10 VCCIO7 (power), N5 PL28B LDQ27/PL34B LDQ33  SOSPI (io), N6 PL28A LDQ27/PL34A LDQ33  CCLK (io), N7 PL24B LDQ27/PL30B LDQ33  DONE (io), N8 PL24A LDQ27/PL30A LDQ33  PROGRAMN (io)
part I pins: D5 NC, N4 TOE (in), P20 VCCJ (power), P21 TCK (in), P22 TDO (out), P23 TDI (in), P24 TMS (in)
part J pins: A2 GND (power), A25 GND (power), AA3 GND (power), AA9 GND (power), AA18 GND (power), AA24 GND (power), AD6 GND (power), AD11 GND (power), AD16 GND (power), AD21 GND (power), AE1 GND (power), AE26 GND (power), AF2 GND (power), AF25 GND (power), B1 GND (power), B26 GND (power), C6 GND (power), C11 GND (power), C16 GND (power), C21 GND (power), F3 GND (power), F9 GND (power), F18 GND (power), F24 GND (power), J6 GND (power), J21 GND (power), K11 GND (power), K13 GND (power), K14 GND (power), K16 GND (power), L3 GND (power), L11 GND (power), L16 GND (power), L24 GND (power), M13 GND (power), M14 GND (power), N9 GND (power), N10 GND (power), N12 GND (power), N13 GND (power), N14 GND (power), N15 GND (power), N17 GND (power), N18 GND (power), P9 GND (power), P10 GND (power), P12 GND (power), P13 GND (power), P14 GND (power), P15 GND (power), P17 GND (power), P18 GND (power), R13 GND (power), R14 GND (power), T3 GND (power), T11 GND (power), T16 GND (power), T24 GND (power), U11 GND (power), U13 GND (power), U14 GND (power), U16 GND (power), V6 GND (power), V21 GND (power)
part K pins: K10 VCCAUX (power), K17 VCCAUX (power), L10 VCCAUX (power), L12 VCC (power), L13 VCC (power), L14 VCC (power), L15 VCC (power), L17 VCCAUX (power), M11 VCC (power), M12 VCC (power), M15 VCC (power), M16 VCC (power), N11 VCC (power), N16 VCC (power), P11 VCC (power), P16 VCC (power), R11 VCC (power), R12 VCC (power), R15 VCC (power), R16 VCC (power), T10 VCCAUX (power), T12 VCC (power), T13 VCC (power), T14 VCC (power), T15 VCC (power), T17 VCCAUX (power), U10 VCCAUX (power), U17 VCCAUX (power)
